# Altium schematic symbol library Sang_library.SchLib: 1607 symbols (part 5 of 15)
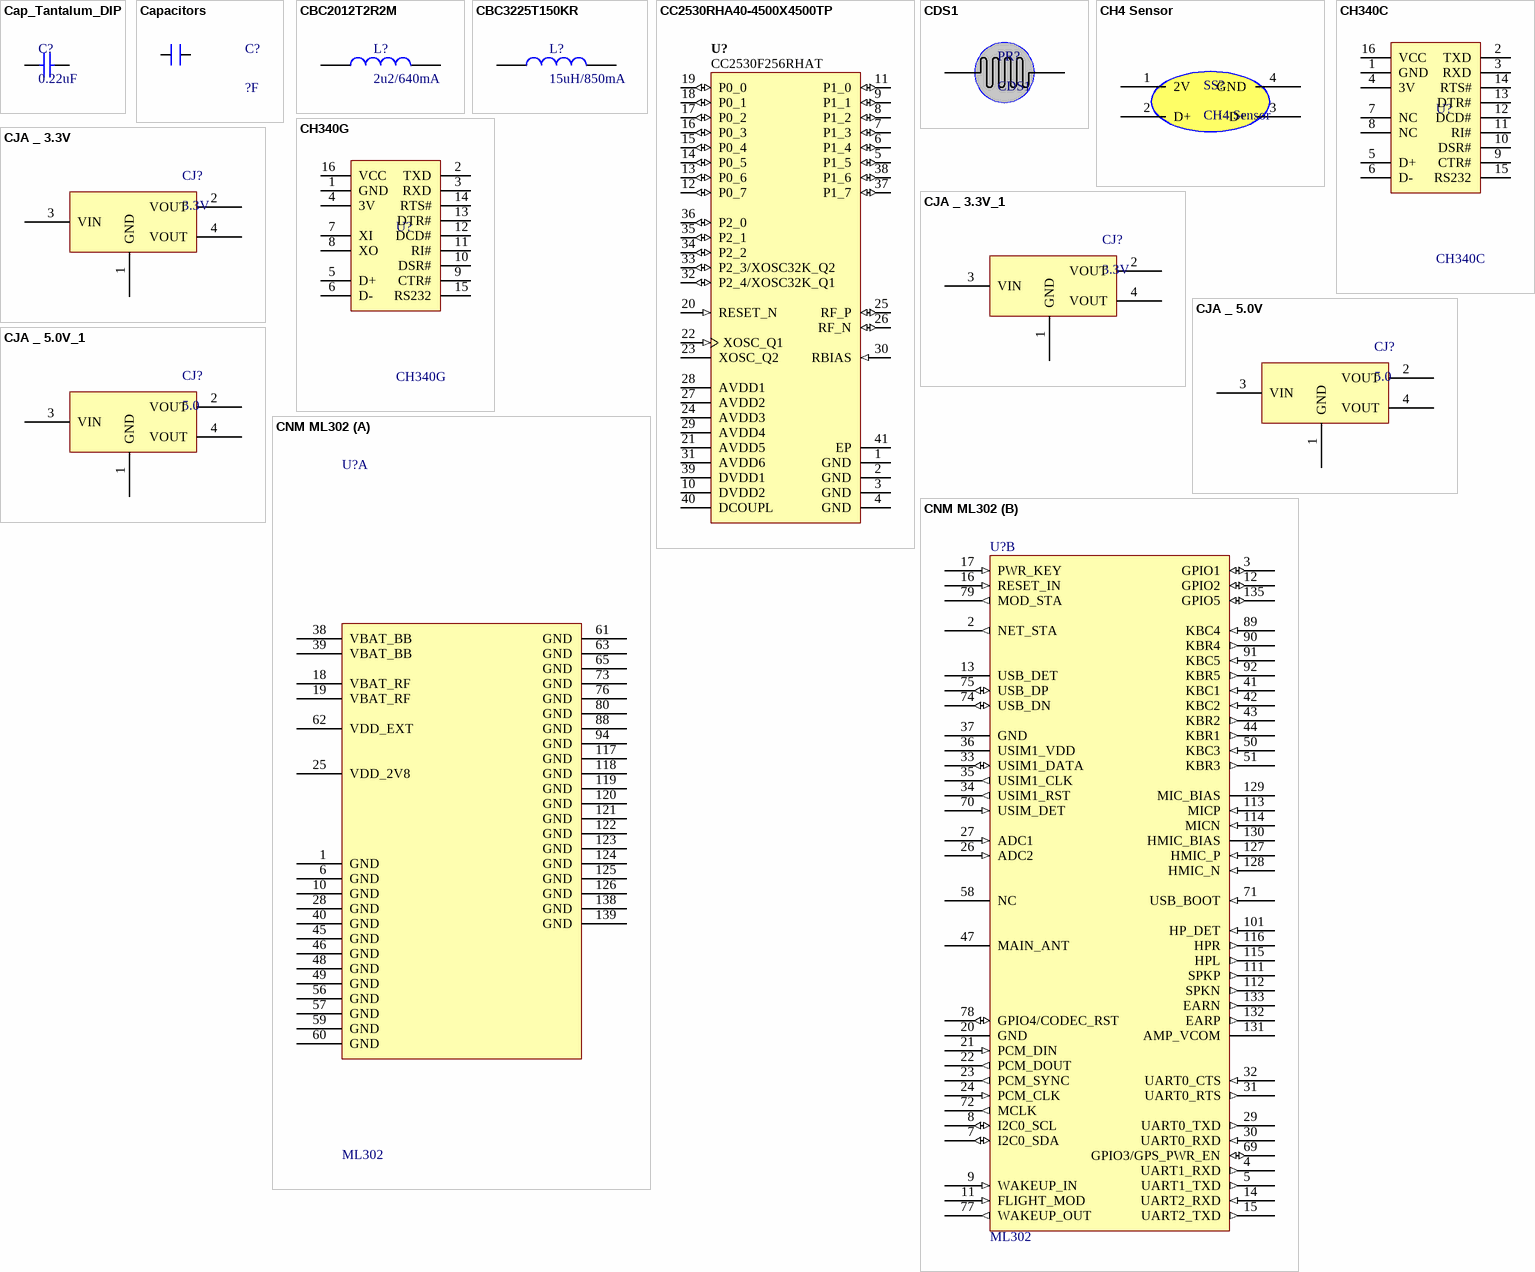
[diagram p102: symbols Cap_Tantalum_DIP to CNM ML302]

## CH4 Sensor
designator SS?
footprint CH4 Sensor
pins: 1 2V, 2 D+, 3 D+, 4 GND

## CH340C
designator U?
High and Low Side Driver; Note: Pins 4, 8 and 14 are not connected; Published: 8-Jun-2000; LatestRevisionDate: 04-Mar-2005; LatestRevisionNote: Stylized 3D Model Added.; DatasheetVersion: PD60147J; PackageReference: PDIP14; Publisher: Altium Limited; PackageDescription: DIP; 14 Leads; Row Spacing 7.62 mm; Pitch 2.54 mm; ComponentLink1Description: Manufacturer Link; ComponentLink1URL: http://www.irf.com/; ComponentLink2Description: Datasheet; ComponentLink2URL: http://www.irf.com/product-info/datasheets/data/ir2110.pdf
footprint SO16 (SOIC, 16-Leads, Body 9.90x3.91mm, Pitch 1.27mm, IPC Medium Density)
pins: 1 GND, 2 TXD, 3 RXD, 4 3V, 5 D+, 6 D-, 7 NC, 8 NC, 9 CTR#, 10 DSR#, 11 RI#, 12 DCD#, 13 DTR#, 14 RTS#, 15 RS232, 16 VCC

## CH340G
designator U?
High and Low Side Driver; Note: Pins 4, 8 and 14 are not connected; Published: 8-Jun-2000; LatestRevisionDate: 04-Mar-2005; LatestRevisionNote: Stylized 3D Model Added.; DatasheetVersion: PD60147J; PackageReference: PDIP14; Publisher: Altium Limited; PackageDescription: DIP; 14 Leads; Row Spacing 7.62 mm; Pitch 2.54 mm; ComponentLink1Description: Manufacturer Link; ComponentLink1URL: http://www.irf.com/; ComponentLink2Description: Datasheet; ComponentLink2URL: http://www.irf.com/product-info/datasheets/data/ir2110.pdf
footprint SO16 (SOIC, 16-Leads, Body 9.90x3.91mm, Pitch 1.27mm, IPC Medium Density)
pins: 1 GND, 2 TXD, 3 RXD, 4 3V, 5 D+, 6 D-, 7 XI, 8 XO, 9 CTR#, 10 DSR#, 11 RI#, 12 DCD#, 13 DTR#, 14 RTS#, 15 RS232, 16 VCC

## CJA _ 3.3V
designator CJ?, comment 3.3V
Dán; Don_Vi: Con; Ten_Linh_Kien: CJA1117B-3.3 SOT89 IC Nguồn 1A 3.3V; Ma_Hang: MH006129; Kieu_Chan: *; Ghi_Chu: *; Chung_Loai: Dán
footprint SOT89-150P410X160-3N (SOT89, 3-Leads, Body 4.5x2.4mm (max), Pitch 1.50mm, Lead Span 4.1mm, IPC Medium Density)
pins: 1 GND, 2 VOUT, 3 VIN, 4 VOUT

## CJA _ 3.3V_1
designator CJ?, comment 3.3V
Dán; Don_Vi: Con; Ten_Linh_Kien: CJA1117B-3.3 SOT89 IC Nguồn 1A 3.3V; Ma_Hang: MH006129; Kieu_Chan: *; Ghi_Chu: *; Chung_Loai: Dán
footprint SOT89-150P410X160-3N (SOT89, 3-Leads, Body 4.5x2.4mm (max), Pitch 1.50mm, Lead Span 4.1mm, IPC Medium Density)
pins: 1 GND, 2 VOUT, 3 VIN, 4 VOUT

## CJA _ 5.0V
designator CJ?, comment 5.0
Dán; Don_Vi: Con; Ten_Linh_Kien: CJA1117B-5.0 SOT89 IC Nguồn 1A 5V; Ma_Hang: MH006128; Kieu_Chan: *; Ghi_Chu: *; Chung_Loai: Dán
footprint SOT89-150P410X160-3N (SOT89, 3-Leads, Body 4.5x2.4mm (max), Pitch 1.50mm, Lead Span 4.1mm, IPC Medium Density)
pins: 1 GND, 2 VOUT, 3 VIN, 4 VOUT

## CJA _ 5.0V_1
designator CJ?, comment 5.0
Dán; Don_Vi: Con; Ten_Linh_Kien: CJA1117B-5.0 SOT89 IC Nguồn 1A 5V; Ma_Hang: MH006128; Kieu_Chan: *; Ghi_Chu: *; Chung_Loai: Dán
footprint SOT89-150P410X160-3N (SOT89, 3-Leads, Body 4.5x2.4mm (max), Pitch 1.50mm, Lead Span 4.1mm, IPC Medium Density)
pins: 1 GND, 2 VOUT, 3 VIN, 4 VOUT

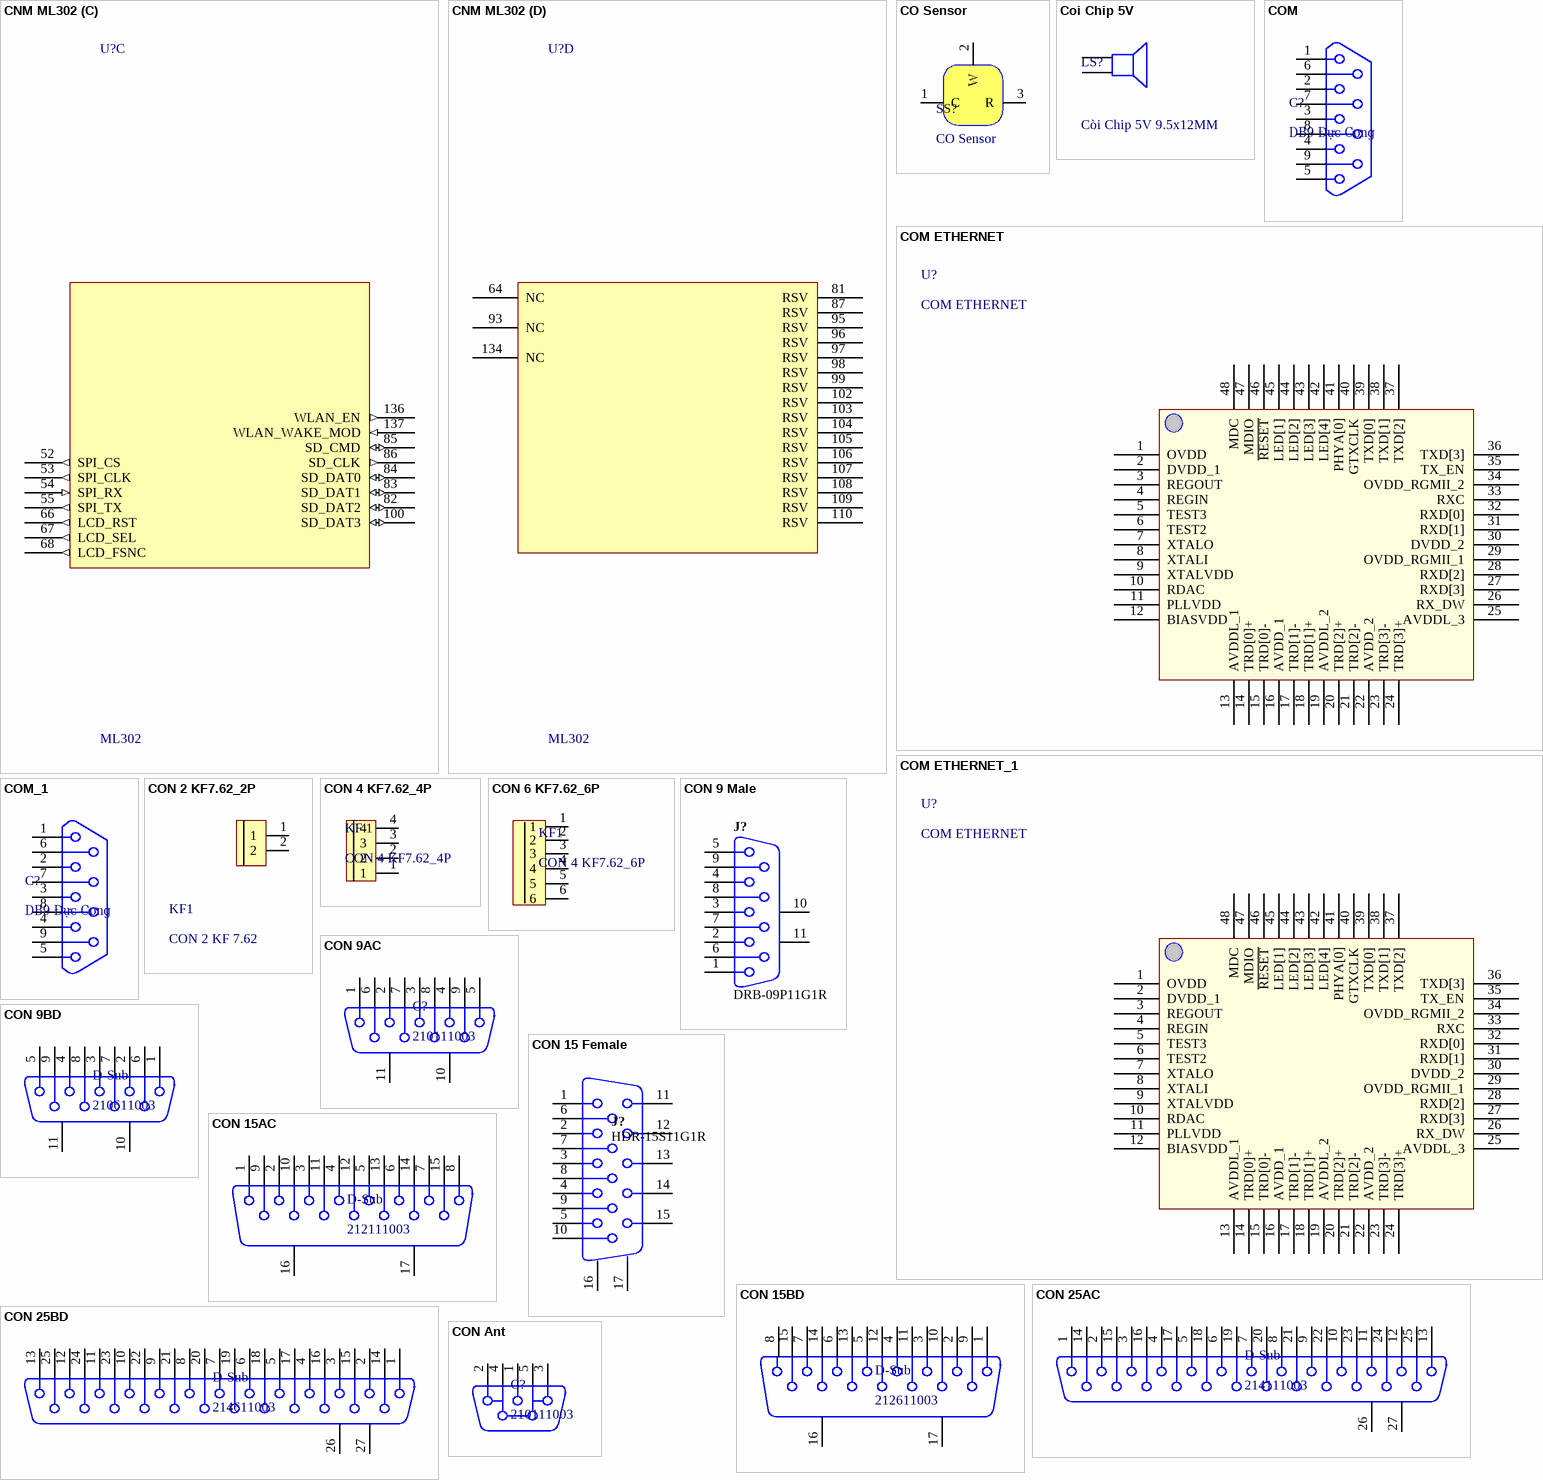
[diagram p27: symbols CNM ML302 to CON Ant]

## CNM ML302
designator U?, comment ML302
LTE CAT 1 Module, B1/B3/B5/B8; MFR: China Mobile; Solder: SMT; Value: ML302; MPN: ML302; Category: MODULE
footprint CNM_ML302 (Footprint not found)
part A pins: 1 GND (power), 6 GND (power), 10 GND (power), 18 VBAT_RF (power), 19 VBAT_RF (power), 25 VDD_2V8 (power), 28 GND (power), 38 VBAT_BB (power), 39 VBAT_BB (power), 40 GND (power), 45 GND (power), 46 GND (power), 48 GND (power), 49 GND (power), 56 GND (power), 57 GND (power), 59 GND (power), 60 GND (power), 61 GND (power), 62 VDD_EXT (power), 63 GND (power), 65 GND (power), 73 GND (power), 76 GND (power), 80 GND (power), 88 GND (power), 94 GND (power), 117 GND (power), 118 GND (power), 119 GND (power), 120 GND (power), 121 GND (power), 122 GND (power), 123 GND (power), 124 GND (power), 125 GND (power), 126 GND (power), 138 GND (power), 139 GND (power)
part B pins: 2 NET_STA (out), 3 GPIO1 (io), 4 UART1_RXD (out), 5 UART1_TXD (out), 7 I2C0_SDA (io), 8 I2C0_SCL (io), 9 WAKEUP_IN (in), 11 FLIGHT_MOD (in), 12 GPIO2 (io), 13 USB_DET (power), 14 UART2_RXD (in), 15 UART2_TXD (out), 16 RESET_IN (in), 17 PWR_KEY (in), 20 GND (power), 21 PCM_DIN (in), 22 PCM_DOUT (out), 23 PCM_SYNC (out), 24 PCM_CLK (in), 26 ADC2 (in), 27 ADC1 (in), 29 UART0_TXD (out), 30 UART0_RXD (in), 31 UART0_RTS (out), 32 UART0_CTS (in), 33 USIM1_DATA (io), 34 USIM1_RST (out), 35 USIM1_CLK (out), 36 USIM1_VDD (power), 37 GND (power), 41 KBC1 (in), 42 KBC2 (in), 43 KBR2 (out), 44 KBR1 (out), 47 MAIN_ANT, 50 KBC3 (in), 51 KBR3 (out), 58 NC, 69 GPIO3/GPS_PWR_EN (io), 70 USIM_DET (in), 71 USB_BOOT (in), 72 MCLK (out), 74 USB_DN (io), 75 USB_DP (io), 77 WAKEUP_OUT (out), 78 GPIO4/CODEC_RST (io), 79 MOD_STA (out), 89 KBC4 (in), 90 KBR4 (out), 91 KBC5 (in), 92 KBR5 (out), 101 HP_DET (in), 111 SPKP (out), 112 SPKN (out), 113 MICP (in), 114 MICN (in), 115 HPL (out), 116 HPR (out), 127 HMIC_P (in), 128 HMIC_N (in), 129 MIC_BIAS (power), 130 HMIC_BIAS (power), 131 AMP_VCOM, 132 EARP (out), 133 EARN (out), 135 GPIO5 (io)
part C pins: 52 SPI_CS (out), 53 SPI_CLK (out), 54 SPI_RX (in), 55 SPI_TX (out), 66 LCD_RST (out), 67 LCD_SEL (out), 68 LCD_FSNC (out), 82 SD_DAT2 (io), 83 SD_DAT1 (io), 84 SD_DAT0 (io), 85 SD_CMD (io), 86 SD_CLK (out), 100 SD_DAT3 (io), 136 WLAN_EN (out), 137 WLAN_WAKE_MOD (in)
part D pins: 64 NC, 81 RSV, 87 RSV, 93 NC, 95 RSV, 96 RSV, 97 RSV, 98 RSV, 99 RSV, 102 RSV, 103 RSV, 104 RSV, 105 RSV, 106 RSV, 107 RSV, 108 RSV, 109 RSV, 110 RSV, 134 NC

## CO Sensor
designator SS?
footprint CO Sensor
pins: 1 C, 2 W, 3 R

## Coi Chip 5V
designator LS?, comment Còi Chip 5V 9.5x12MM
Cắm; Don_Vi: Con; Ma_Hang: MH000902; Ten_Linh_Kien: Còi Chip 5V 9.5x12MM; Ghi_Chu: *; Kieu_Chan: *; Chung_Loai: Cắm
footprint SPEAKER
footprint SP1 (Speaker Telphone on Broad)
footprint SPEAKER
pins: 1, 2

## COM
designator C?, comment DB9 Đực Cong
Cắm; Don_Vi: Con; Ma_Hang: MH001165; Ten_Linh_Kien: DB9 Đực Cong; Ghi_Chu: *; Kieu_Chan: *; Chung_Loai: Cắm
footprint DSB 9-M (COM MALE D Subminiature; 9 Position; Right Angle; Pitch 1.385 mm)
pins: 1, 2, 3, 4, 5, 6, 7, 8, 9

## COM ETHERNET
designator U?
pins: 1 OVDD, 2 DVDD_1, 3 REGOUT, 4 REGIN, 5 TEST3, 6 TEST2, 7 XTALO, 8 XTALI, 9 XTALVDD, 10 RDAC, 11 PLLVDD, 12 BIASVDD, 13 AVDDL_1, 14 TRD[0]+, 15 TRD[0]-, 16 AVDD_1, 17 TRD[1]-, 18 TRD[1]+, 19 AVDDL_2, 20 TRD[2]+, 21 TRD[2]-, 22 AVDD_2, 23 TRD[3]-, 24 TRD[3]+, 25 AVDDL_3, 26 RX_DW, 27 RXD[3], 28 RXD[2], 29 OVDD_RGMII_1, 30 DVDD_2, 31 RXD[1], 32 RXD[0], 33 RXC, 34 OVDD_RGMII_2, 35 TX_EN, 36 TXD[3], 37 TXD[2], 38 TXD[1], 39 TXD[0], 40 GTXCLK, 41 PHYA[0], 42 LED[4], 43 LED[3], 44 LED[2], 45 LED[1], 46 ~{RESET}, 47 MDIO, 48 MDC

## COM ETHERNET_1
designator U?, comment COM ETHERNET
pins: 1 OVDD, 2 DVDD_1, 3 REGOUT, 4 REGIN, 5 TEST3, 6 TEST2, 7 XTALO, 8 XTALI, 9 XTALVDD, 10 RDAC, 11 PLLVDD, 12 BIASVDD, 13 AVDDL_1, 14 TRD[0]+, 15 TRD[0]-, 16 AVDD_1, 17 TRD[1]-, 18 TRD[1]+, 19 AVDDL_2, 20 TRD[2]+, 21 TRD[2]-, 22 AVDD_2, 23 TRD[3]-, 24 TRD[3]+, 25 AVDDL_3, 26 RX_DW, 27 RXD[3], 28 RXD[2], 29 OVDD_RGMII_1, 30 DVDD_2, 31 RXD[1], 32 RXD[0], 33 RXC, 34 OVDD_RGMII_2, 35 TX_EN, 36 TXD[3], 37 TXD[2], 38 TXD[1], 39 TXD[0], 40 GTXCLK, 41 PHYA[0], 42 LED[4], 43 LED[3], 44 LED[2], 45 LED[1], 46 ~{RESET}, 47 MDIO, 48 MDC

## COM_1
designator C?, comment DB9 Đực Cong
Cắm; Don_Vi: Con; Ma_Hang: MH001165; Ten_Linh_Kien: DB9 Đực Cong; Ghi_Chu: *; Kieu_Chan: *; Chung_Loai: Cắm
footprint DSB 9-M (COM MALE D Subminiature; 9 Position; Right Angle; Pitch 1.385 mm)
pins: 1, 2, 3, 4, 5, 6, 7, 8, 9

## CON 2 KF7.62_2P
designator KF1, comment CON 2 KF 7.62
Cắm; Ma_Hang: MH002053; Ten_Linh_Kien: CON 2 KF7.62-2P 7.62MM (Đen Thẳng); Chung_Loai: Cắm; Ghi_Chu: *; Kieu_Chan: *; Don_Vi: Con
footprint CON 2KF 7.62 - 2P
pins: 1, 2

## CON 4 KF7.62_4P
designator KF 1
Cắm
footprint CON 2 KF7.62_4P
pins: 1, 2, 3, 4

## CON 6 KF7.62_6P
designator KF1, comment CON 4 KF7.62_6P
Cắm; Ma_Hang: MH007527; Ten_Linh_Kien: CON 4 KF7.62-4P 7.62MM (Đen Thẳng); Ghi_Chu: *; Kieu_Chan: *; Don_Vi: Con; Chung_Loai: Cắm
footprint CON 2 KF7.62_6P
pins: 1, 2, 3, 4, 5, 6

## CON 9 Male
designator J?, comment DRB-09P11G1R
Connector, DB9 R/A Through-hole Male; Connector type: Header; Max Current: 3A; Mounting Technology: Through-Hole; Pin Count: 9; Status: Unreleased; Category: Connector
footprint DB9_MALE
pins: 1, 2, 3, 4, 5, 6, 7, 8, 9, 10 MH1, 11 MH2

## CON 9AC
designator C?, comment 210111003
D-SUB-Filter Connectors WE-DS, Solder Pin Straight; Manufacturer: Würth Elektronik eiSos GmbH; partNo: 210111003; ComponentLink1Description: Manufacturer; ComponentLink1URL: http://www.we-online.de; Created by: Christin Zierenner; Created Date: May 2012; ComponentLink2Description: Datasheet; ComponentLink2URL: http://katalog.we-online.de/kataloge/eisos/index.php?language=en&pf=Filter_gerade
footprint COM9A (D-SUB- 9P, MALE, RT ANGLE, TH)
footprint COM9C (D-SUB- 9P, MALE, SOLDER BUCKET VERTICAL MOUNT, TH)
footprint COM9SMDA (D-SUB- 9P, MALE, RT ANGLE, SMT)
pins: 1, 2, 3, 4, 5, 6, 7, 8, 9, 10 MH1, 11 MH2

## CON 9BD
designator D-Sub, comment 210611003
D-SUB-Filter Connectors WE-DS, Solder Pin Straight; Manufacturer: Würth Elektronik eiSos GmbH; partNo: 210611003; ComponentLink1Description: Manufacturer; ComponentLink1URL: http://www.we-online.de; Created by: Christin Zierenner; Created Date: May 2012; ComponentLink2Description: Datasheet; ComponentLink2URL: http://katalog.we-online.de/kataloge/eisos/index.php?language=en&pf=Filter_gerade
footprint COM9B (D-SUB- 9P, FEMALE, RT ANGLE, TH)
footprint COM9D (D-SUB- 9P, FEMALE, SOLDER BUCKET VERTICAL MOUNT, TH)
footprint COM9SMDB (D-SUB- 9P, FEMALE, RT ANGLE, SMT)
pins: 1, 2, 3, 4, 5, 6, 7, 8, 9, 10 MH1, 11 MH2

## CON 15 Female
designator J?, comment HDR-15S11G1R
Socket, High-Density DB15 (HD15) R/A Female Through-hole; Connector type: Right Angle; Max Current: 3 A; Category: Connector; Mounting Technology: Through-Hole; Pin Count: 15; Status: Unreleased
footprint DB15-VGA-Female
pins: 1 "Red Video", 2 "Green Video", 3 "Blue Video", 4 "Monitor ID Bit 2 (Ground)", 5 (power) "Ground", 6 (power) "Red Return (Ground)", 7 (power) "Green Return (Ground)", 8 (power) "Blue Return (Ground)", 9 "Key (not used)", 10 (power) "Sync Return (Ground)", 11 (power) "Monitor ID Bit 0 (Ground)", 12 "Monitor ID Bit 1 (Not Used)", 13 "Horizontal Zync", 14 "Vertical Sync", 15 "Vertical Sync", 16 MH1 "shield", 17 MH2 "shield"

## CON 15AC
designator D-Sub, comment 212111003
D-SUB-Filter Connectors WE-DS, Solder Pin Straight; Manufacturer: Würth Elektronik eiSos GmbH; partNo: 212111003; ComponentLink1Description: Manufacturer; ComponentLink1URL: http://www.we-online.de; Created by: Christin Zierenner; Created Date: May 2012; ComponentLink2Description: Datasheet; ComponentLink2URL: http://katalog.we-online.de/kataloge/eisos/index.php?language=en&pf=Filter_gerade
footprint COM15A (D-SUB- 15P, MALE, RT ANGLE, TH)
footprint COM15C (D-SUB- 15P, MALE, SOLDER BUCKET, TH)
footprint COM15SMDA (D-SUB- 15P, MALE, RT ANGLE, SMT)
pins: 1, 2, 3, 4, 5, 6, 7, 8, 9, 10, 11, 12, 13, 14, 15, 16 MH1, 17 MH2

## CON 15BD
designator D-Sub, comment 212611003
D-SUB-Filter Connectors WE-DS, Solder Pin Straight; Manufacturer: Würth Elektronik eiSos GmbH; partNo: 212611003; ComponentLink1Description: Manufacturer; ComponentLink1URL: http://www.we-online.de; Created by: Christin Zierenner; Created Date: May 2012; ComponentLink2Description: Datasheet; ComponentLink2URL: http://katalog.we-online.de/kataloge/eisos/index.php?language=en&pf=Filter_gerade
footprint COM15B (D-SUB- 15P, FEMALE, RT ANGLE, TH)
footprint COM15D (D-SUB- 15P, FEMALE, SOLDER BUCKET, TH)
footprint COM15SMDB (D-SUB- 15P, FEMALE, RT ANGLE, SMT)
pins: 1, 2, 3, 4, 5, 6, 7, 8, 9, 10, 11, 12, 13, 14, 15, 16 MH1, 17 MH2

## CON 25AC
designator D-Sub, comment 214111003
D-SUB-Filter Connectors WE-DS, Solder Pin Straight; Manufacturer: Würth Elektronik eiSos GmbH; partNo: 214111003; ComponentLink1Description: Manufacturer; ComponentLink1URL: http://www.we-online.de; Created by: Christin Zierenner; Created Date: May 2012; ComponentLink2Description: Datasheet; ComponentLink2URL: http://katalog.we-online.de/kataloge/eisos/index.php?language=en&pf=Filter_gerade
footprint COM25A (D-SUB- 25P, MALE, RT ANGLE, TH)
footprint COM25C (D-SUB- 25P, MALE, STRAIGHT, TH)
pins: 1, 2, 3, 4, 5, 6, 7, 8, 9, 10, 11, 12, 13, 14, 15, 16, 17, 18, 19, 20, 21, 22, 23, 24, 25, 26 MH1, 27 MH2

## CON 25BD
designator D-Sub, comment 214611003
D-SUB-Filter Connectors WE-DS, Solder Pin Straight; Manufacturer: Würth Elektronik eiSos GmbH; partNo: 214611003; ComponentLink1Description: Manufacturer; ComponentLink1URL: http://www.we-online.de; Created by: Christin Zierenner; Created Date: May 2012; ComponentLink2Description: Datasheet; ComponentLink2URL: http://katalog.we-online.de/kataloge/eisos/index.php?language=en&pf=Filter_gerade
footprint COM25B (D-SUB- 25P, FEMALE, RT ANGLE, TH)
footprint COM25D (D-SUB- 25P, FEMALE, SOLDER BUCKET, TH)
pins: 1, 2, 3, 4, 5, 6, 7, 8, 9, 10, 11, 12, 13, 14, 15, 16, 17, 18, 19, 20, 21, 22, 23, 24, 25, 26 MH1, 27 MH2

## CON Ant
designator C?, comment 210111003
CONNECTOR ANTEN; Manufacturer: Würth Elektronik eiSos GmbH; partNo: 210111003; ComponentLink1Description: Manufacturer; ComponentLink1URL: http://www.we-online.de; Created by: Christin Zierenner; Created Date: May 2012; ComponentLink2Description: Datasheet; ComponentLink2URL: http://katalog.we-online.de/kataloge/eisos/index.php?language=en&pf=Filter_gerade
footprint SMA-ENDLAUNCH
footprint SMA-RA
footprint SMA-V
footprint SMA_ENDLAUNCH
pins: 1, 2, 3, 4, 5

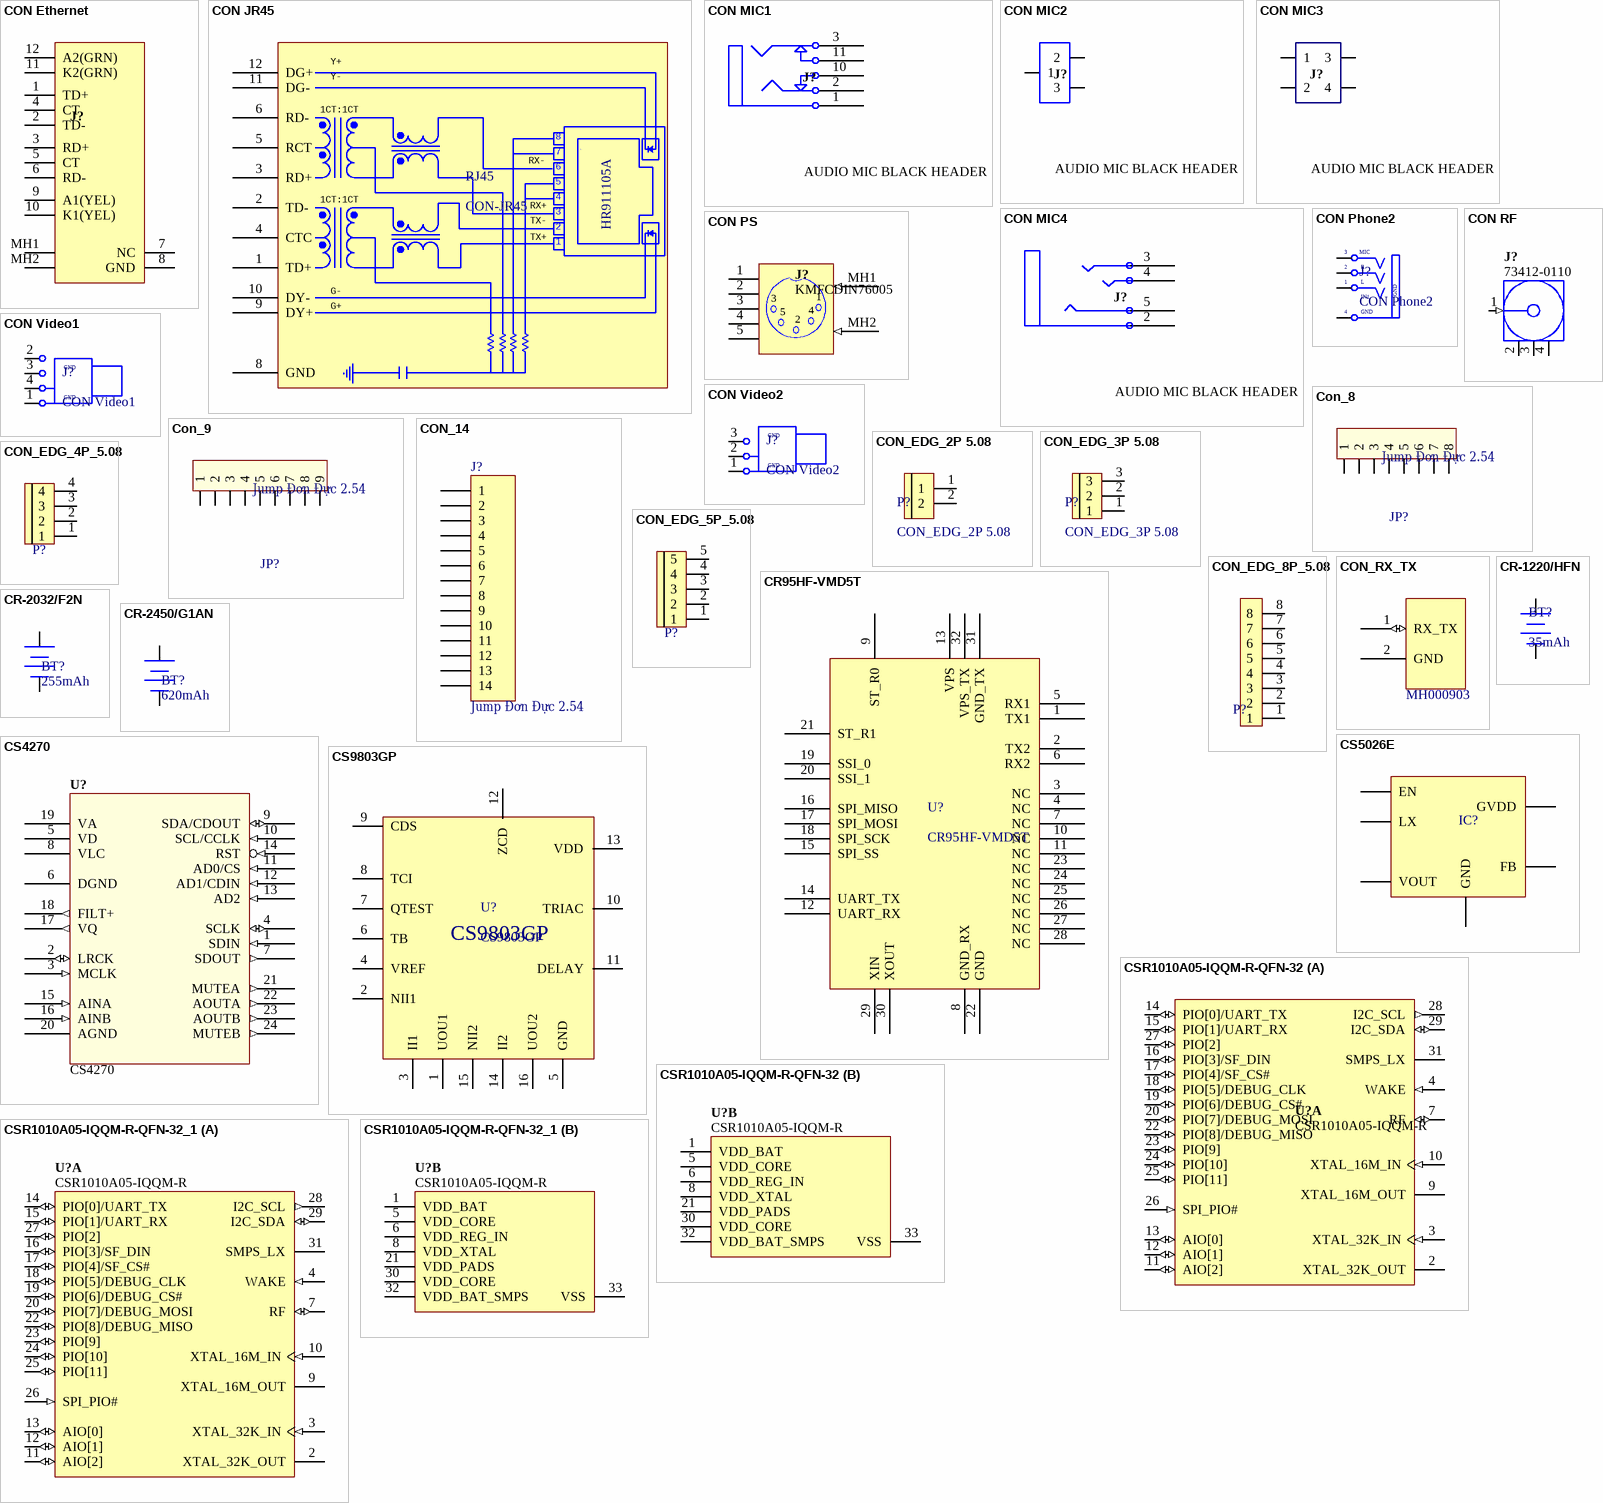
[diagram p28: symbols CON Ethernet to CSR1010A05-IQQM-R-QFN-32_1]

## CON Ethernet
designator J?
Socket, PC Jack 8-Way, R/A Low-profile; Connector type: Right Angle; Max Current: mA; Mounting Technology: Surface Mount; Status: Unreleased; Category: Connector
footprint Ethernet (Connector; PCB Jack, Thru-Hole; 1-Port, 8 Positions, 8 Loaded; Shielded without Lightpipes; Vertical)
pins: 1 TD+, 2 TD-, 3 RD+, 4 CT, 5 CT, 6 RD-, 7 NC, 8 GND, 9 A1(YEL), 10 K1(YEL), 11 K2(GRN), 12 A2(GRN), MH1, MH2

## CON JR45
designator RJ45, comment CON-JR45
footprint CON JR45
pins: 1 TD+, 2 TD-, 3 RD+, 4 CTC, 5 RCT, 6 RD-, 8 GND (power), 9 DY+, 10 DY-, 11 DG-, 12 DG+
text: Y+; Y-; 1CT:1CT; 7; RX-; RX+; TX-; HR911105A; TX+; G-; G+

## CON MIC1
designator J?, comment AUDIO MIC BLACK HEADER
Connector, 3.5mm Stereo Audio Socket, Black, 2 break contacts (normals) and 2 auxiliary make contacts; Connector type: AUDIO BLACK HEADER; Category: Connector; Status: Production
footprint CON MIC1
pins: 1, 2, 3, 10, 11

## CON MIC2
designator J?, comment AUDIO MIC BLACK HEADER
Connector, 3.5mm Stereo Audio Socket, Black, 2 break contacts (normals) and 2 auxiliary make contacts; Connector type: AUDIO BLACK HEADER; Category: Connector; Status: Production
footprint CON MIC2
pins: 1, 2, 3

## CON MIC3
designator J?, comment AUDIO MIC BLACK HEADER
Connector, 3.5mm Stereo Audio Socket, Black, 2 break contacts (normals) and 2 auxiliary make contacts; Connector type: AUDIO BLACK HEADER; Category: Connector; Status: Production
footprint CON MIC3
pins: 1, 2, 3, 4

## CON MIC4
designator J?, comment AUDIO MIC BLACK HEADER
PJ320A PJ320D; Connector type: AUDIO BLACK HEADER; Category: Connector; Status: Production
footprint PJ-320D (Jack Audio 3.5MM PJ-320D 4P)
pins: 2, 3, 4, 5

## CON Phone2
designator J?
Jac Phone Stereo; Creat by: VanDungEvn@Gmail.com
footprint 3.5mm
pins: 2 S1 "Tip Normal (Break Contact)", 3 TN "Tip Normal (Break Contact)", 4 S (power) "Sleeve (Ground)", 5 GND "Tip"
text: MIC; R; 1; L; IN1

## CON PS
designator J?, comment KMFCDIN76005
Socket, 5-way R/A DIN; Connector type: Right Angle; Max Current: mA; Mounting Technology: Through-Hole; Status: Unreleased; Category: Connector
footprint KMFCDIN76005
pins: 1, 2, 3, 4, 5, MH1 (in), MH2 (in)

## CON RF
designator J?, comment 73412-0110
Microcoaxial RF, 50 Ohm, PCB Vertical Jack Receptacle, SMT, 1.25mm Mounted Height; Sub-class: Serial Bus; IEC-class: Connector; Body Length: 4 mm; Datasheet: http://www.molex.com/webdocs/datasheets/pdf/en-us/0734120110_RF_COAX_CONNECTORS.pdf; Terminal Pitch: 3 mm; Class: Connector
footprint CON RF (Microcoaxial RF, 50 Ohm, PCB Vertical Jack Receptacle, SMT, 1.25mm Mounted Height)
pins: 1 Signal (in) "Signal Pin", 2 GND (power), 3 GND (power), 4 GND (power)

## CON Video1
designator J?
Jac Video Stereo
footprint TRC-005 (RCA Phono Jack, Right Angle, Thru-Hole, Body 20.8 x 9.8 x 11 mm (LxWxH))
pins: 1 Black, 2 Yellow, 3 White, 4 Red
text: GND

## CON Video2
designator J?
Jac Video Stereo
footprint TRC-006
pins: 1, 2, 3
text: GND

## Con_8
designator JP?, comment Jump Đơn Đực 2.54
Cắm; Value: Jump Đơn Đực 2.54MM 1x40P Thẳng 11MM; Don_Vi: Con; Ma_Hang: MH000903; Kieu Chan: *; Ghi Chu: *
footprint CON8
pins: 1, 2, 3, 4, 5, 6, 7, 8

## Con_9
designator JP?, comment Jump Đơn Đực 2.54
Cắm; Value: Jump Đơn Đực 2.54MM 1x40P Thẳng 11MM; Ma_Hang: MH000903; Don_Vi: Con; Kieu Chan: *; Ghi Chu: *
footprint CON9
pins: 1, 2, 3, 4, 5, 6, 7, 8, 9

## CON_14
designator J?, comment Jump Đơn Đực 2.54
Cắm; Value: Jump Đơn Đực 2.54MM 1x40P Thẳng 11MM; Don_Vi: Con; Ma_Hang: MH000903; Ghi Chu: *; Kieu Chan: *
pins: 1, 2, 3, 4, 5, 6, 7, 8, 9, 10, 11, 12, 13, 14

## CON_EDG_2P 5.08
designator P?
Cắm; Ten_Linh_Kien: CON 2 2EDG5.08-2P 5.08MM ( Xanh Cong); Don_Vi: Con; Ma_Hang: MH000759; Ghi_Chu: *; Kieu_Chan: *; Chung_Loai: Cắm
footprint CON 2 2EDG5.08
pins: 1, 2

## CON_EDG_3P 5.08
designator P?
Cắm; Ten_Linh_Kien: CON 3 2EDG5.08-3P 5.08MM ( Xanh Cong); Don_Vi: Con; Ma_Hang: MH000760; Ghi_Chu: *; Kieu_Chan: *; Chung_Loai: Cắm
footprint CON 3 3EDG5.08
pins: 1, 2, 3

## CON_EDG_4P_5.08
designator P?, comment CON 4 2EDG5.08  (value not drawn)
Cắm; Ten_Linh_Kien: CON 4 2EDG5.08-4P 5.08MM ( Xanh Cong); Ma_Hang: MH000979; Don_Vi: Con; Ghi_Chu: *; Kieu_Chan: *; Chung_Loai: Cắm
footprint CON 4 4EDG5.08
pins: 1, 2, 3, 4

## CON_EDG_5P_5.08
designator P?, comment CON 5 2EDG5.08  (value not drawn)
Cắm; Ten_Linh_Kien: CON 5 2EDG5.08-5P 5.08MM ( Xanh Cong); Ma_Hang: MH003589; Kieu_Chan: *; Don_Vi: Con; Ghi_Chu: *; Chung_Loai: Cắm
footprint CON 5 5EDG5.08
pins: 1, 2, 3, 4, 5

## CON_EDG_8P_5.08
designator P?, comment CON 8 2EDG5.08  (value not drawn)
Cắm; Ten_Linh_Kien: CON 8 2EDG5.08-8P 5.08MM ( Xanh Cong); Ma_Hang: MH000978; Don_Vi: Con; Ghi_Chu: *; Kieu_Chan: *; Chung_Loai: Cắm
footprint CON 8 8EDG5.08
pins: 1, 2, 3, 4, 5, 6, 7, 8

## CON_RX_TX
designator JP?, comment MH000903
Cắm; Value: Jump Đơn Đực 2.54MM 1x40P Thẳng 11MM
footprint HDR1X2 (Footprint not found)
pins: 1 RX_TX (io), 2 GND (power)

## CR95HF-VMD5T
designator U?
TRANSCEIVER 13.56MHZ 32-VFQFPN; Solder: SMT; Value: CR95HF-VMD5T; MPN: CR95HF-VMD5T; Category: IC
footprint VFQFN-32 (32-VFQFN Exposed Pad)
pins: 1 TX1, 2 TX2, 3 NC, 4 NC, 5 RX1, 6 RX2, 7 NC, 8 GND_RX, 9 ST_R0, 10 NC, 11 NC, 12 UART_RX, 13 VPS, 14 UART_TX, 15 SPI_SS, 16 SPI_MISO, 17 SPI_MOSI, 18 SPI_SCK, 19 SSI_0, 20 SSI_1, 21 ST_R1, 22 GND, 23 NC, 24 NC, 25 NC, 26 NC, 27 NC, 28 NC, 29 XIN, 30 XOUT, 31 GND_TX, 32 VPS_TX

## CR-1220/HFN
designator BT?, comment 35mAh
BATTERY LITHIUM 3V 35mAh COIN 12.5MM; MPN: CR-1220/HFN; Solder: HAND; CompanyID: VT-01136; Value: 35mAh
footprint BATERRY_CR1220
pins: 1 +, 2 -

## CR-2032/F2N
designator BT?, comment 255mAh
BATTERY LITHIUM 3V 225mAh COIN 20MM; MPN: CR-2032/F2N; Solder: HAND; CompanyID: VT-01026; Value: 255mAh
footprint BATTERY_CR2032 SMD
pins: 1 +, 2 -

## CR-2450/G1AN
designator BT?, comment 620mAh
BATTERY LITHIUM 3V 620mAhCOIN 24.5MM; MPN: CR-2450/G1AN; Solder: HAND; CompanyID: VT-00216; Value: 620mAh
footprint BATERRY_CR2450-3P
pins: 1 +, 2 -

## CS4270
designator U?
CS4270; 24-Bit, 192 kHz Stereo Audio CODEC; AudioICTypes: Amplifier; Supply Voltage: mV; Mounting Technology: Surface Mount; Status: Unreleased; Category: IC-Audio
footprint TSSOP24 (TSSOP, 24-Leads, Body 7.80x4.40mm, Pitch 0.65mm, IPC High Density)
pins: 1 SDIN (in), 2 LRCK (io), 3 MCLK (in), 4 SCLK (io), 5 VD (power), 6 DGND (power), 7 SDOUT (out), 8 VLC (power), 9 SDA/CDOUT (io), 10 SCL/CCLK (in), 11 AD0/CS (in), 12 AD1/CDIN (in), 13 AD2 (in), 14 RST (in), 15 AINA (in), 16 AINB (in), 17 VQ (out), 18 FILT+ (out), 19 VA (power), 20 AGND (power), 21 MUTEA (out), 22 AOUTA (out), 23 AOUTB (out), 24 MUTEB (out)

## CS5026E
designator IC?  (value not drawn)
footprint HSO16 (SOIC, 16-Leads, Body 9.90x3.91mm, Pitch 1.27mm, IPC Medium Density)
pins: 4,8,12,17 GND, 5,6,7 LX, 9 VOUT, 10 GVDD, 13 FB, 14 EN

## CS9803GP
designator U?
Infrared Induction Control IC
footprint DIP16
pins: 1 UOU1, 2 NII1, 3 II1, 4 VREF, 5 GND (power), 6 TB (power), 7 QTEST (power), 8 TCI (power), 9 CDS (power), 10 TRIAC (power), 11 DELAY (power), 12 ZCD (power), 13 VDD (power), 14 II2 (power), 15 NII2 (power), 16 UOU2 (power)

## CSR1010A05-IQQM-R-QFN-32
designator U?, comment CSR1010A05-IQQM-R
Bluetooth Low Energy Single-mode IC, 64 KB RAM and 64 KB ROM, -30 to 85 degC, 32-pin QFN; Manufacturer: CSR; Stop bits No.: 1 or 2; I/O Supply Voltage (VDD_PADS): 1.2 to 3.6 V; Digital IO No.: 12; Packing: Tape and Reel; Flow control: CTS / RTS; Bits per byte: 8; Baud Rate (max): 2Mbaud (<=1%Error); Baud Rate (min): 1200 baud (<=2%Error); ComponentLink2Description: Datasheet; ComponentLink2URL: https://www.csrsupport.com/download/39359/CSR1010%20Data%20Sheet%20CS-231985-DS.pdf; PartNumber: CSR1010A05-IQQM-R; DatasheetVersion: Rev. 4; Memory Size: 64KB RAM and 64KB ROM; ComponentLink3URL: https://www.csrsupport.com/download/39359/CSR1010%20Data%20Sheet%20CS-231985-DS.pdf; Mounting Technology: Surface Mount; Operating Temperature: -30 to 85 degC; PackageDescription: 32-Pin Quad Flat No-lead Package, Body 5x5mm, Pitch 0.5mm; ComponentLink1URL: http://csr.com/; PackageReference: QFN-32; ComponentLink3Description: Package Specification; ComponentLink1Description: Manufacturer URL
footprint QFN32 (QFN, 32-Leads, Body 5x5 mm, Pitch 0.5mm, IPC High Density)
part A pins: 2 XTAL_32K_OUT "Drive for sleep clock crystal.", 3 XTAL_32K_IN (in) "32.768kHz sleep clock input.", 4 WAKE (in) "Input to wake CSR1010 QFN from hibernate or dormant.", 7 RF (io) "Bluetooth transmitter / receiver.", 9 XTAL_16M_OUT "Drive for crystal.", 10 XTAL_16M_IN (in) "Reference clock input.", 11 AIO[2] (io) "Analogue programmable I/O line.", 12 AIO[1] (io) "Analogue programmable I/O line.", 13 AIO[0] (io) "Analogue programmable I/O line.", 14 PIO[0]/UART_TX (io) "Programmable I/O line or UART TX.", 15 PIO[1]/UART_RX (io) "Programmable I/O line or UART RX.", 16 PIO[3]/SF_DIN (io) "Programmable I/O line or SPI serial flash data (SF_DIN) input. If connecting to SPI serial flash, this pin connects to SI on the serial flash. See Section 5.3.", 17 PIO[4]/SF_CS# (io) "Programmable I/O line or SPI serial flash chip select (SF_CS#), see Section 5.3.", 18 PIO[5]/DEBUG_CLK (io) "Programmable I/O line or debug SPI CLK selected by SPI_PIO#.", 19 PIO[6]/DEBUG_CS# (io) "Programmable I/O line or debug SPI chip select (CS#) selected by SPI_PIO#.", 20 PIO[7]/DEBUG_MOSI (io) "Programmable I/O line or debug SPI MOSI selected by SPI_PIO#.", 22 PIO[8]/DEBUG_MISO (io) "Programmable I/O line or debug SPI MISO selected by SPI_PIO#.", 23 PIO[9] (io) "Programmable I/O line.", 24 PIO[10] (io) "Programmable I/O line.", 25 PIO[11] (io) "Programmable I/O line.", 26 SPI_PIO# (in) "Selects SPI debug on PIO[8:5].", 27 PIO[2] (io) "Programmable I/O line or I2C power.", 28 I2C_SCL (out) "I2C clock or SPI serial flash clock output (SF_CLK), see Section 5.3.", 29 I2C_SDA (io) "I2C data input / output or SPI serial flash data output (SF_DOUT). If connecting to SPI serial flash, connect this pin to SO on the serial flash. See Section 5.3.", 31 SMPS_LX (power) "High-voltage switch-mode regulator output."
part B pins: 1 VDD_BAT (power) "Battery input and regulator enable (active high).", 5 VDD_CORE (power) "Positive supply for digital domain.", 6 VDD_REG_IN (power) "Positive supply for Bluetooth radio and digital linear regulator.", 8 VDD_XTAL (power) "Decouple with 470nF capacitor to ground.", 21 VDD_PADS (power) "Positive supply for all digital I/O ports PIO[11:0].", 30 VDD_CORE (power) "Positive supply for digital domain.", 32 VDD_BAT_SMPS (power) "Input to high-voltage switch-mode regulator.", 33 VSS (power) "Ground connections."

## CSR1010A05-IQQM-R-QFN-32_1
designator U?, comment CSR1010A05-IQQM-R
Bluetooth Low Energy Single-mode IC, 64 KB RAM and 64 KB ROM, -30 to 85 degC, 32-pin QFN; Manufacturer: CSR; Stop bits No.: 1 or 2; I/O Supply Voltage (VDD_PADS): 1.2 to 3.6 V; Digital IO No.: 12; Packing: Tape and Reel; Flow control: CTS / RTS; Bits per byte: 8; Baud Rate (max): 2Mbaud (<=1%Error); Baud Rate (min): 1200 baud (<=2%Error); ComponentLink2Description: Datasheet; ComponentLink2URL: https://www.csrsupport.com/download/39359/CSR1010%20Data%20Sheet%20CS-231985-DS.pdf; PartNumber: CSR1010A05-IQQM-R; DatasheetVersion: Rev. 4; Memory Size: 64KB RAM and 64KB ROM; ComponentLink3URL: https://www.csrsupport.com/download/39359/CSR1010%20Data%20Sheet%20CS-231985-DS.pdf; Mounting Technology: Surface Mount; Operating Temperature: -30 to 85 degC; PackageDescription: 32-Pin Quad Flat No-lead Package, Body 5x5mm, Pitch 0.5mm; ComponentLink1URL: http://csr.com/; PackageReference: QFN-32; ComponentLink3Description: Package Specification; ComponentLink1Description: Manufacturer URL
footprint QFN32 (QFN, 32-Leads, Body 5x5 mm, Pitch 0.5mm, IPC High Density)
part A pins: 2 XTAL_32K_OUT "Drive for sleep clock crystal.", 3 XTAL_32K_IN (in) "32.768kHz sleep clock input.", 4 WAKE (in) "Input to wake CSR1010 QFN from hibernate or dormant.", 7 RF (io) "Bluetooth transmitter / receiver.", 9 XTAL_16M_OUT "Drive for crystal.", 10 XTAL_16M_IN (in) "Reference clock input.", 11 AIO[2] (io) "Analogue programmable I/O line.", 12 AIO[1] (io) "Analogue programmable I/O line.", 13 AIO[0] (io) "Analogue programmable I/O line.", 14 PIO[0]/UART_TX (io) "Programmable I/O line or UART TX.", 15 PIO[1]/UART_RX (io) "Programmable I/O line or UART RX.", 16 PIO[3]/SF_DIN (io) "Programmable I/O line or SPI serial flash data (SF_DIN) input. If connecting to SPI serial flash, this pin connects to SI on the serial flash. See Section 5.3.", 17 PIO[4]/SF_CS# (io) "Programmable I/O line or SPI serial flash chip select (SF_CS#), see Section 5.3.", 18 PIO[5]/DEBUG_CLK (io) "Programmable I/O line or debug SPI CLK selected by SPI_PIO#.", 19 PIO[6]/DEBUG_CS# (io) "Programmable I/O line or debug SPI chip select (CS#) selected by SPI_PIO#.", 20 PIO[7]/DEBUG_MOSI (io) "Programmable I/O line or debug SPI MOSI selected by SPI_PIO#.", 22 PIO[8]/DEBUG_MISO (io) "Programmable I/O line or debug SPI MISO selected by SPI_PIO#.", 23 PIO[9] (io) "Programmable I/O line.", 24 PIO[10] (io) "Programmable I/O line.", 25 PIO[11] (io) "Programmable I/O line.", 26 SPI_PIO# (in) "Selects SPI debug on PIO[8:5].", 27 PIO[2] (io) "Programmable I/O line or I2C power.", 28 I2C_SCL (out) "I2C clock or SPI serial flash clock output (SF_CLK), see Section 5.3.", 29 I2C_SDA (io) "I2C data input / output or SPI serial flash data output (SF_DOUT). If connecting to SPI serial flash, connect this pin to SO on the serial flash. See Section 5.3.", 31 SMPS_LX (power) "High-voltage switch-mode regulator output."
part B pins: 1 VDD_BAT (power) "Battery input and regulator enable (active high).", 5 VDD_CORE (power) "Positive supply for digital domain.", 6 VDD_REG_IN (power) "Positive supply for Bluetooth radio and digital linear regulator.", 8 VDD_XTAL (power) "Decouple with 470nF capacitor to ground.", 21 VDD_PADS (power) "Positive supply for all digital I/O ports PIO[11:0].", 30 VDD_CORE (power) "Positive supply for digital domain.", 32 VDD_BAT_SMPS (power) "Input to high-voltage switch-mode regulator.", 33 VSS (power) "Ground connections."
